# Altium schematic symbol library resistors.SchLib: 2581 symbols (part 18 of 18)
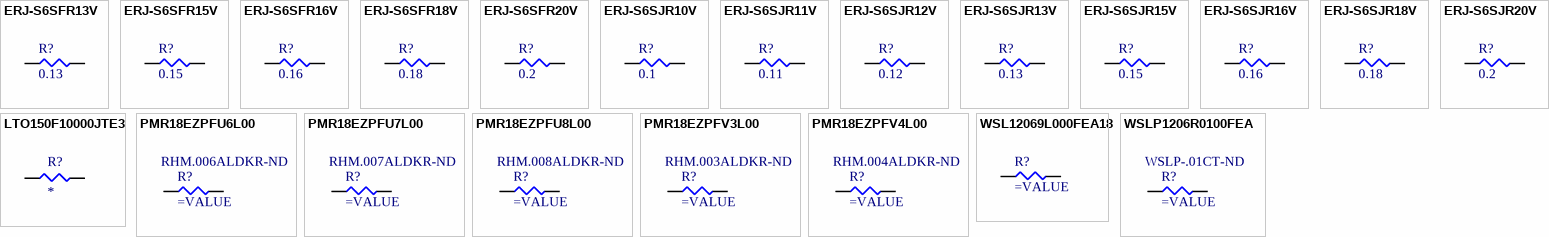
[diagram p81: symbols ERJ-S6SFR13V to WSLP1206R0100FEA]

## WSL12069L000FEA18
designator R?
RES SMD 0.009 OHM 1% 1/2W 1206; Manufacturer: Vishay Dale; Manufacturer Part Number: WSL12069L000FEA18; Description: RES SMD 9 MOHM 1% 1/2W 1206; Resistance: 9mR; Temperature Coefficient: 75ppm/°C; Power Rating: 500mW; Supplier 1: Digi-Key; Stock 1: 8029; Pricing 1: 1=1.54, 10=1.361, 25=1.2508, 50=1.1412, 100=0.9875, 250=0.83392, 500=0.70224, 1000=0.58374 (USD); Mount: Surface Mount; Case/Package: 1206; Contact Plating: Tin,Matte; Case Code (Metric): 3216; Case Code (Imperial): 1206; Min Operating Temperature: -65°C; Max Operating Temperature: 170°C; Tolerance: 1%; Composition: Metal Element,Metal Strip; Package Quantity: 1; Packaging: Tape and Reel; Number of Terminations: 2; Termination: SMD/SMT; Max Power Dissipation: 500mW; Features: Moisture Resistant; Length: 3.2mm; Height: 0.635mm; Width: 0.063inch; Depth: 1.6mm; Radiation Hardening: No; REACH SVHC: Unknown; Lead Free: Lead Free; ComponentLink1URL: http://www.vishay.com/docs/31057/wslhigh.pdf?src-supplier=Digi-Key; ComponentLink1Description: http://www.vishay.com/docs/31057/wslhigh.pdf?src-supplier=Digi-Key; ComponentLink2URL: http://www.farnell.com/datasheets/2049120.pdf?src-supplier=Element14; ComponentLink2Description: http://www.farnell.com/datasheets/2049120.pdf?src-supplier=Element14; Supplier Part Number 1: WSLD-.009DKR-ND
footprint SMD-1206-RES
pins: 1, 2

## WSLP1206R0100FEA
designator R?  Supplier Part Number 1: WSLP-.01CT-ND
RES SMD 0.01 OHM 1% 1W 1206; Manufacturer: Vishay Dale; Manufacturer Part Number: WSLP1206R0100FEA; Description: RES 0.01 OHM 1% 1W 1206; Resistance: 10mR; Temperature Coefficient: 75ppm/°C; Supplier 1: Digi-Key; Stock 1: 0; Mount: Surface Mount; Case/Package: 1206; Number of Pins: 2; Weight: 0.000571oz; Contact Plating: Tin; Case Code (Metric): 3216; Case Code (Imperial): 1206; Min Operating Temperature: -65°C; Max Operating Temperature: 170°C; Tolerance: 1%; Composition: Metal Element,Metal Strip; Power Rating: 1W; Packaging: Tape and Reel; Number of Terminations: 2; Max Power Dissipation: 1W; Features: Moisture Resistant; Package Quantity: 1; Termination: SMD/SMT; Military Standard: Not; Length: 3.2mm; Height: 0.635mm; Width: 0.063inch; Depth: 1.6mm; Radiation Hardening: No; REACH SVHC: Unknown; Lead Free: Lead Free; ComponentLink1URL: http://www.vishay.com/docs/30122/wslp.pdf?src-supplier=Digi-Key; ComponentLink1Description: http://www.vishay.com/docs/30122/wslp.pdf?src-supplier=Digi-Key; ComponentLink2URL: http://www.farnell.com/datasheets/2049155.pdf?src-supplier=Element14; ComponentLink2Description: http://www.farnell.com/datasheets/2049155.pdf?src-supplier=Element14
footprint SMD-1206-RES
pins: 1, 2